# Altium integrated library Diode-SMD_V2.IntLib: 415 symbols (part 1 of 2)
Pins are listed as number, name and electrical type; pins without a type are passive.

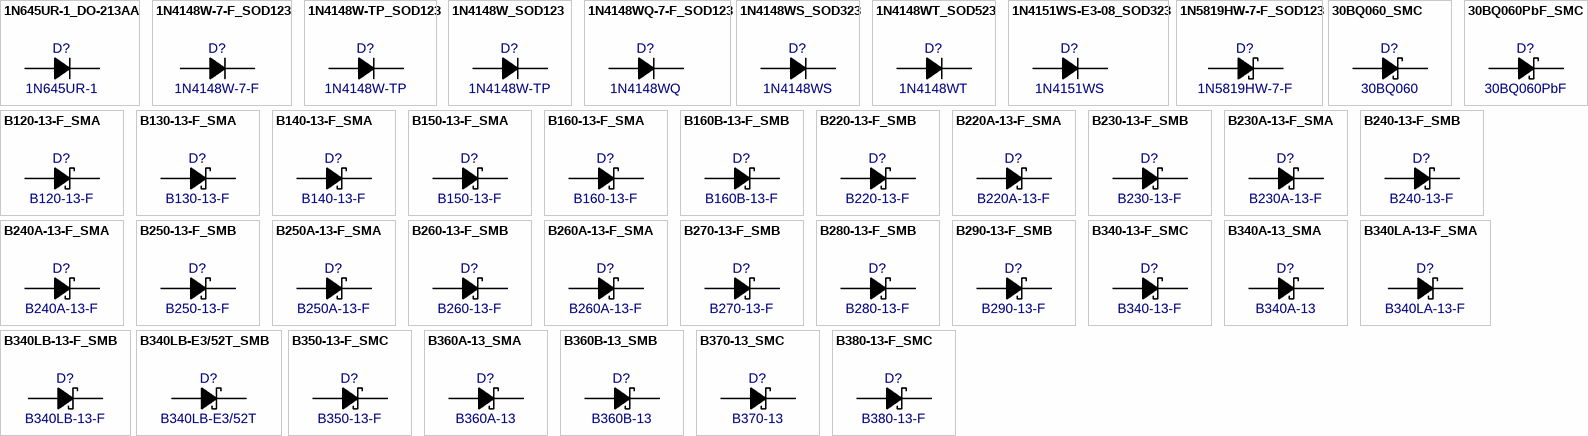
[diagram p0: symbols 1N645UR-1_DO-213AA to B380-13-F_SMC]

## 1N645UR-1_DO-213AA
designator D?, comment 1N645UR-1
Diode Silicon Rectifier 225V 400mA; Manufacturer: Microsemi; Package: DO-213AA; EDM-PN: *; Text2: *; Text1: *; Value: 1N645UR-1; SAAB PN: *; DCE Part No: *; Part Number: 1N645UR-1
footprint DO-213AA (DO-213AA 3.5x1.65mm)
pins: 1 C, 2 A

## 1N4148W-7-F_SOD123
designator D?, comment 1N4148W-7-F
Diode High Speed Switching 100V 150mA; Manufacturer: Diodes; Package: SOD123; EDM-PN: *; Text2: *; Text1: *; Value: 1N4148W-7-F; SAAB PN: *; DCE Part No: *; Part Number: 1N4148W-7-F
footprint SOD123 (SOD 123 2.85x1.7mm)
pins: 1 C, 2 A

## 1N4148W-TP_SOD123
designator D?, comment 1N4148W-TP
Diode High Speed Switching 100V 150mA; Manufacturer: MCC; EDM-PN: DIO242; Package: SOD123; Text2: *; Text1: *; Value: 1N4148W-TP; SAAB PN: *; Part Number: 1N4148W-TP; DCE Part No: *
footprint SOD123 (SOD 123 2.85x1.7mm)
pins: 1 C, 2 A

## 1N4148W_SOD123
designator D?, comment 1N4148W-TP
Diode High Speed Switching 100V 150mA; Manufacturer: MCC; Package: SOD123; EDM-PN: *; Text2: *; Text1: *; Value: 1N4148W-TP; SAAB PN: *; DCE Part No: *; Part Number: 1N4148W-TP
footprint SOD123 (SOD 123 2.85x1.7mm)
pins: 1 C, 2 A

## 1N4148WQ-7-F_SOD123
designator D?, comment value 1N4148WQ  (hidden comment: 1N4148WQ-7-F)
Diode Switching 100V 300mA; Manufacturer: Diodes; Package: SOD123; EDM-PN: *; Text2: *; Text1: *; SAAB PN: *; Part Number: 1N4148WQ-7-F; DCE Part No: *
footprint SOD123 (SOD 123 2.85x1.7mm)
pins: 1 C, 2 A

## 1N4148WS_SOD323
designator D?, comment 1N4148WS
Diode Fast Switching 75V 150mA; Manufacturer: Diodes; EDM-PN: DIO195; Package: SOD323; Text2: *; Text1: *; Value: 1N4148WS; SAAB PN: *; Part Number: 1N4148WS; DCE Part No: *
footprint SOD323 (Diode, SOD323 2-Leads, Body 1.7x1.25mm, IPC Medium Density)
pins: 1 C, 2 A

## 1N4148WT_SOD523
designator D?, comment 1N4148WT
Diode General Purpose 75V 200mA; Manufacturer: On Semi; EDM-PN: DIO284; Package: SOD523; Text2: *; Text1: *; Value: 1N4148WT; SAAB PN: *; Part Number: 1N4148WT; DCE Part No: *
footprint SOD523 (SOD523 1.25x0.85mm)
pins: 1 C, 2 A

## 1N4151WS-E3-08_SOD323
designator D?, comment value 1N4151WS  (hidden comment: 1N4151WS-E3-08)
Diode General Purpose 50V 150mA; Manufacturer: Vishay; Package: SOD323; EDM-PN: *; Text2: *; Text1: *; SAAB PN: *; Part Number: 1N4151WS-E3-08; DCE Part No: *
footprint SOD323 (Diode, SOD323 2-Leads, Body 1.7x1.25mm, IPC Medium Density)
pins: 1 C, 2 A

## 1N5819HW-7-F_SOD123
designator D?, comment 1N5819HW-7-F
Diode Schottky Barrier Rectifier 40V 1Amp; Manufacturer: Diodes; Package: SOD123; EDM-PN: *; Text2: *; Text1: *; Value: 1N5819HW-7-F; SAAB PN: *; Part Number: 1N5819HW-7-F; DCE Part No: *
footprint SOD123 (SOD 123 2.85x1.7mm)
pins: 1 C, 2 A

## 30BQ060_SMC
designator D?, comment 30BQ060
Diode Schottky Rectifier; Manufacturer: IRF; Package: SMC; EDM-PN: *; Text2: *; Text1: *; Value: 30BQ060; SAAB PN: *; DCE Part No: *; Part Number: 30BQ060
footprint SMC (Molded Diode, 2-Leads, Body 6.9x5.8mm, IPC Medium Density)
pins: 1 C, 2 A

## 30BQ060PbF_SMC
designator D?, comment 30BQ060PbF
Diode Schottky Rectifier; Manufacturer: IRF; Package: SMC; EDM-PN: *; Text2: *; Text1: *; Value: 30BQ060PbF; SAAB PN: *; Part Number: 30BQ060PbF; DCE Part No: *
footprint SMC (Molded Diode, 2-Leads, Body 6.9x5.8mm, IPC Medium Density)
pins: 1 C, 2 A

## B120-13-F_SMA
designator D?, comment B120-13-F
Diode Schottky Power Rectifier 1A 20V; Manufacturer: Diodes; EDM-PN: DIO132; Package: SMA; Text2: *; Text1: *; Value: B120-13-F; SAAB PN: *; DCE Part No: *; Part Number: B120-13-F
footprint SMA (SMA 5.6x2.95mm)
pins: 1 C, 2 A

## B130-13-F_SMA
designator D?, comment B130-13-F
Diode Schottky Power Rectifier 1A 30V; Manufacturer: Diodes; Package: SMA; EDM-PN: *; Text2: *; Text1: *; Value: B130-13-F; SAAB PN: *; Part Number: B130-13-F; DCE Part No: *
footprint SMA (SMA 5.6x2.95mm)
pins: 1 C, 2 A

## B140-13-F_SMA
designator D?, comment B140-13-F
Diode Schottky Power Rectifier 1A 40V; Manufacturer: Diodes; EDM-PN: DIO144; Package: SMA; Text2: *; Text1: *; Value: B140-13-F; SAAB PN: *; Part Number: B140-13-F; DCE Part No: *
footprint SMA (SMA 5.6x2.95mm)
pins: 1 C, 2 A

## B150-13-F_SMA
designator D?, comment B150-13-F
Diode Schottky Power Rectifier 1A 50V; Manufacturer: Diodes; Package: SMA; EDM-PN: *; Text2: *; Text1: *; Value: B150-13-F; SAAB PN: *; Part Number: B150-13-F; DCE Part No: *
footprint SMA (SMA 5.6x2.95mm)
pins: 1 C, 2 A

## B160-13-F_SMA
designator D?, comment B160-13-F
Diode Schottky Power Rectifier 1A 60V; Manufacturer: Diodes; Package: SMA; EDM-PN: *; Text2: *; Text1: *; Value: B160-13-F; SAAB PN: *; Part Number: B160-13-F; DCE Part No: *
footprint SMA (SMA 5.6x2.95mm)
pins: 1 C, 2 A

## B160B-13-F_SMB
designator D?, comment B160B-13-F
Diode Schottky Rectifier 1Amp 60V; Manufacturer: Diodes; Package: SMB; EDM-PN: *; Text2: *; Text1: *; Value: B160B-13-F; SAAB PN: *; Part Number: B160B-13-F; DCE Part No: *
footprint SMB (SMB 4.75x3.94mm)
pins: 1 C, 2 A

## B220-13-F_SMB
designator D?, comment B220-13-F
Diode Schottky Power Rectifier 2A 20V; Manufacturer: Diodes; Package: SMB; EDM-PN: *; Text2: *; Text1: *; Value: B220-13-F; SAAB PN: *; DCE Part No: *; Part Number: B220-13-F
footprint SMB (SMB 4.75x3.94mm)
pins: 1 C, 2 A

## B220A-13-F_SMA
designator D?, comment B220A-13-F
Diode Schottky Power Rectifier 2A 20V; Manufacturer: Diodes; Package: SMA; EDM-PN: *; Text2: *; Text1: *; Value: B220A-13-F; SAAB PN: *; DCE Part No: *; Part Number: B220A-13-F
footprint SMA (SMA 5.6x2.95mm)
pins: 1 C, 2 A

## B230-13-F_SMB
designator D?, comment B230-13-F
Diode Schottky Power Rectifier 2A 30V; Manufacturer: Diodes; Package: SMB; EDM-PN: *; Text2: *; Text1: *; Value: B230-13-F; SAAB PN: *; DCE Part No: *; Part Number: B230-13-F
footprint SMB (SMB 4.75x3.94mm)
pins: 1 C, 2 A

## B230A-13-F_SMA
designator D?, comment B230A-13-F
Diode Schottky Power Rectifier 2A 30V; Manufacturer: Diodes; Package: SMA; EDM-PN: *; Text2: *; Text1: *; Value: B230A-13-F; SAAB PN: *; Part Number: B230A-13-F; DCE Part No: *
footprint SMA (SMA 5.6x2.95mm)
pins: 1 C, 2 A

## B240-13-F_SMB
designator D?, comment B240-13-F
Diode Schottky Power Rectifier 2A 40V; Manufacturer: Diodes; Package: SMB; EDM-PN: *; Text2: *; Text1: *; Value: B240-13-F; SAAB PN: *; Part Number: B240-13-F; DCE Part No: *
footprint SMB (SMB 4.75x3.94mm)
pins: 1 C, 2 A

## B240A-13-F_SMA
designator D?, comment B240A-13-F
Diode Schottky Power Rectifier 2A 40V; Manufacturer: Diodes; Package: SMA; EDM-PN: *; Text2: *; Text1: *; Value: B240A-13-F; SAAB PN: *; Part Number: B240A-13-F; DCE Part No: *
footprint SMA (SMA 5.6x2.95mm)
pins: 1 C, 2 A

## B250-13-F_SMB
designator D?, comment B250-13-F
Diode Schottky Power Rectifier 2A 50V; Manufacturer: Diodes; Package: SMB; EDM-PN: *; Text2: *; Text1: *; Value: B250-13-F; SAAB PN: *; Part Number: B250-13-F; DCE Part No: *
footprint SMB (SMB 4.75x3.94mm)
pins: 1 C, 2 A

## B250A-13-F_SMA
designator D?, comment B250A-13-F
Diode Schottky Power Rectifier 2A 50V; Manufacturer: Diodes; Package: SMA; EDM-PN: *; Text2: *; Text1: *; Value: B250A-13-F; SAAB PN: *; Part Number: B250A-13-F; DCE Part No: *
footprint SMA (SMA 5.6x2.95mm)
pins: 1 C, 2 A

## B260-13-F_SMB
designator D?, comment B260-13-F
Diode Schottky Power Rectifier 2A 60V; Manufacturer: Diodes; Package: SMB; EDM-PN: *; Text2: *; Text1: *; Value: B260-13-F; SAAB PN: *; Part Number: B260-13-F; DCE Part No: *
footprint SMB (SMB 4.75x3.94mm)
pins: 1 C, 2 A

## B260A-13-F_SMA
designator D?, comment B260A-13-F
Diode Schottky Power Rectifier 2A 60V; Manufacturer: Diodes; Package: SMA; EDM-PN: *; Text2: *; Text1: *; Value: B260A-13-F; SAAB PN: *; Part Number: B260A-13-F; DCE Part No: *
footprint SMA (SMA 5.6x2.95mm)
pins: 1 C, 2 A

## B270-13-F_SMB
designator D?, comment B270-13-F
Diode Schottky Power Rectifier 2A 70V; Manufacturer: Diodes; Package: SMB; EDM-PN: *; Text2: *; Text1: *; Value: B270-13-F; SAAB PN: *; Part Number: B270-13-F; DCE Part No: *
footprint SMB (SMB 4.75x3.94mm)
pins: 1 C, 2 A

## B280-13-F_SMB
designator D?, comment B280-13-F
Diode Schottky Power Rectifier 2A 80V; Manufacturer: Diodes; Package: SMB; EDM-PN: *; Text2: *; Text1: *; Value: B280-13-F; SAAB PN: *; Part Number: B280-13-F; DCE Part No: *
footprint SMB (SMB 4.75x3.94mm)
pins: 1 C, 2 A

## B290-13-F_SMB
designator D?, comment B290-13-F
Diode Schottky Power Rectifier 2A 90V; Manufacturer: Diodes; Package: SMB; EDM-PN: *; Text2: *; Text1: *; Value: B290-13-F; SAAB PN: *; Part Number: B290-13-F; DCE Part No: *
footprint SMB (SMB 4.75x3.94mm)
pins: 1 C, 2 A

## B340-13-F_SMC
designator D?, comment B340-13-F
Diode Schottky Barrier Rectifier 40V 3Amp; Manufacturer: Diodes; Package: SMC; EDM-PN: *; Text2: *; Text1: *; Value: B340-13-F; SAAB PN: *; Part Number: B340-13-F; DCE Part No: *
footprint SMC (Molded Diode, 2-Leads, Body 6.9x5.8mm, IPC Medium Density)
pins: 1 C, 2 A

## B340A-13_SMA
designator D?, comment B340A-13
Diode Schottky Barrier Rectifier 40V 3Amp; Manufacturer: Diodes; Package: SMA; EDM-PN: *; Text2: *; Text1: *; Value: B340A-13; SAAB PN: *; Part Number: B340A-13; DCE Part No: *
footprint SMA (SMA 5.6x2.95mm)
pins: 1 C, 2 A

## B340LA-13-F_SMA
designator D?, comment B340LA-13-F
Diode Schottky Barrier Rectifier 40V 3Amp; Manufacturer: Diodes; Package: SMA; EDM-PN: *; Text2: *; Text1: *; Value: B340LA-13-F; SAAB PN: *; Part Number: B340LA-13-F; DCE Part No: *
footprint SMA (SMA 5.6x2.95mm)
pins: 1 C, 2 A

## B340LB-13-F_SMB
designator D?, comment B340LB-13-F
Diode Schottky Rectifier 40V 3Amp; Manufacturer: Diodes; Package: SMB; EDM-PN: *; Text2: *; Text1: *; Value: B340LB-13-F; SAAB PN: *; Part Number: B340LB-13-F; DCE Part No: *
footprint SMB (SMB 4.75x3.94mm)
pins: 1 C, 2 A

## B340LB-E3/52T_SMB
designator D?, comment B340LB-E3/52T
Diode Schottky Rectifier 40V 3Amp; Manufacturer: Vishay; Package: SMB; EDM-PN: *; Text2: *; Text1: *; Value: B340LB-E3/52T; SAAB PN: *; Part Number: B340LB-E3/52T; DCE Part No: *
footprint SMB (SMB 4.75x3.94mm)
pins: 1 C, 2 A

## B350-13-F_SMC
designator D?, comment B350-13-F
Diode Schottky Rectifier 50V 3Amp; Manufacturer: Diodes; Package: SMC; EDM-PN: *; Text2: *; Text1: *; Value: B350-13-F; SAAB PN: *; Part Number: B350-13-F; DCE Part No: *
footprint SMC (Molded Diode, 2-Leads, Body 6.9x5.8mm, IPC Medium Density)
pins: 1 C, 2 A

## B360A-13_SMA
designator D?, comment B360A-13
Diode Schottky Barrier Rectifier 60V 3Amp; Manufacturer: Diodes; EDM-PN: DIO156; Package: SMA; Text2: *; Text1: *; Value: B360A-13; SAAB PN: *; Part Number: B360A-13; DCE Part No: *
footprint SMA (SMA 5.6x2.95mm)
pins: 1 C, 2 A

## B360B-13_SMB
designator D?, comment B360B-13
Diode Schottky Barrier Rectifier 60V 3Amp; Manufacturer: Diodes; Package: SMB; EDM-PN: *; Text2: *; Text1: *; Value: B360B-13; SAAB PN: *; Part Number: B360B-13; DCE Part No: *
footprint SMB (SMB 4.75x3.94mm)
pins: 1 C, 2 A

## B370-13_SMC
designator D?, comment B370-13
Diode Schottky Barrier Rectifier 70V 3Amp; Manufacturer: Diodes; Package: SMC; EDM-PN: *; Text2: *; Text1: *; Value: B370-13; SAAB PN: *; Part Number: B370-13; DCE Part No: *
footprint SMC (Molded Diode, 2-Leads, Body 6.9x5.8mm, IPC Medium Density)
pins: 1 C, 2 A

## B380-13-F_SMC
designator D?, comment B380-13-F
Diode Schottky Barrier Rectifier 80V 3Amp; Manufacturer: Diodes; Package: SMC; EDM-PN: *; Text2: *; Text1: *; Value: B380-13-F; SAAB PN: *; Part Number: B380-13-F; DCE Part No: *
footprint SMC (Molded Diode, 2-Leads, Body 6.9x5.8mm, IPC Medium Density)
pins: 1 C, 2 A

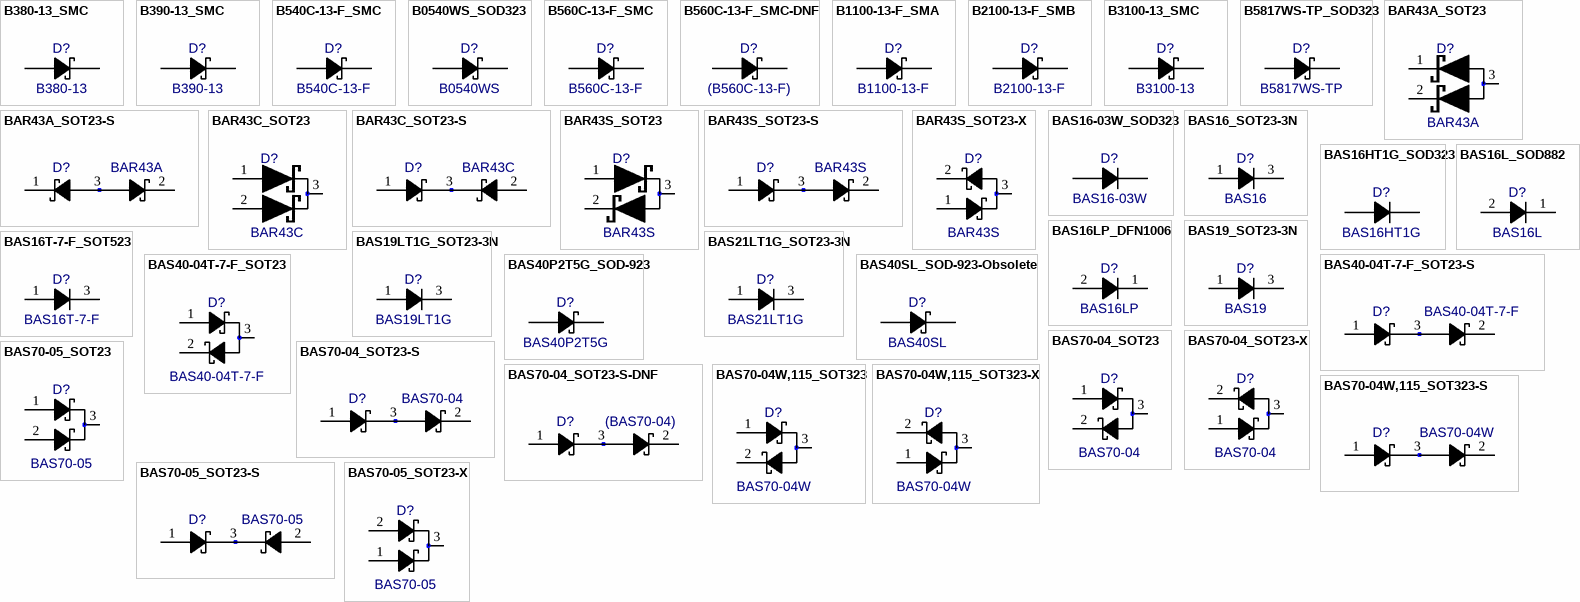
[diagram p1: symbols B380-13_SMC to BAS70-05_SOT23-X]

## B380-13_SMC
designator D?, comment B380-13
Diode Schottky Barrier Rectifier 80V 3Amp; Manufacturer: Diodes; Package: SMC; EDM-PN: *; Text2: *; Text1: *; Value: B380-13; SAAB PN: *; Part Number: B380-13; DCE Part No: *
footprint SMC (Molded Diode, 2-Leads, Body 6.9x5.8mm, IPC Medium Density)
pins: 1 C, 2 A

## B390-13_SMC
designator D?, comment B390-13
Diode Schottky Barrier Rectifier 90V 3Amp; Manufacturer: Diodes; Package: SMC; EDM-PN: *; Text2: *; Text1: *; Value: B390-13; SAAB PN: *; Part Number: B390-13; DCE Part No: *
footprint SMC (Molded Diode, 2-Leads, Body 6.9x5.8mm, IPC Medium Density)
pins: 1 C, 2 A

## B540C-13-F_SMC
designator D?, comment B540C-13-F
Diode Schottky Barrier Rectifier 40V 5Amp; Manufacturer: Diodes; Package: SMC; EDM-PN: *; Text2: *; Text1: *; Value: B540C-13-F; SAAB PN: *; Part Number: B540C-13-F; DCE Part No: *
footprint SMC (Molded Diode, 2-Leads, Body 6.9x5.8mm, IPC Medium Density)
pins: 1 C, 2 A

## B0540WS_SOD323
designator D?, comment B0540WS
Diode Schottky Barrier Rectifier 40V 0.5A; Manufacturer: Diodes; EDM-PN: DIO185; Package: SOD323; Text2: *; Text1: *; Value: B0540WS; SAAB PN: *; Part Number: B0540WS; DCE Part No: *
footprint SOD323 (Diode, SOD323 2-Leads, Body 1.7x1.25mm, IPC Medium Density)
pins: 1 C, 2 A

## B560C-13-F_SMC
designator D?, comment B560C-13-F
Diode Schottky Barrier Rectifier 60V 5Amp; Manufacturer: Diodes; EDM-PN: DIO135; Package: SMC; Text2: *; Text1: *; Value: B560C-13-F; SAAB PN: *; Part Number: B560C-13-F; DCE Part No: *
footprint SMC (Molded Diode, 2-Leads, Body 6.9x5.8mm, IPC Medium Density)
pins: 1 C, 2 A

## B560C-13-F_SMC-DNF
designator D?, comment value (B560C-13-F)  (hidden comment: B560C-13-F)
Diode Schottky Barrier Rectifier 60V 5Amp - Do not Fit; Manufacturer: Diodes; Part Number: DNF - B560C-13-F; EDM-PN: DIO135; Package: SMC; Text2: *; Text1: *; SAAB PN: *; DCE Part No: *
footprint SMC (Molded Diode, 2-Leads, Body 6.9x5.8mm, IPC Medium Density)
pins: 1 C, 2 A

## B1100-13-F_SMA
designator D?, comment B1100-13-F
Diode Schottky Power Rectifier  100V 1A; Manufacturer: Diodes; Package: SMA; EDM-PN: *; Text2: *; Text1: *; Value: B1100-13-F; SAAB PN: *; Part Number: B1100-13-F; DCE Part No: *
footprint SMA (SMA 5.6x2.95mm)
pins: 1 C, 2 A

## B2100-13-F_SMB
designator D?, comment B2100-13-F
Diode Schottky Power Rectifier 2A 100V; Manufacturer: Diodes; Package: SMB; EDM-PN: *; Text2: *; Text1: *; Value: B2100-13-F; SAAB PN: *; Part Number: B2100-13-F; DCE Part No: *
footprint SMB (SMB 4.75x3.94mm)
pins: 1 C, 2 A

## B3100-13_SMC
designator D?, comment B3100-13
Diode Schottky Barrier Rectifier 100V 3Amp; Manufacturer: Diodes; Package: SMC; EDM-PN: *; Text2: *; Text1: *; Value: B3100-13; SAAB PN: *; Part Number: B3100-13; DCE Part No: *
footprint SMC (Molded Diode, 2-Leads, Body 6.9x5.8mm, IPC Medium Density)
pins: 1 C, 2 A

## B5817WS-TP_SOD323
designator D?, comment B5817WS-TP
Diode Schottky 20V 1A; Manufacturer: MCC; Package: SOD323; EDM-PN: *; Text2: *; Text1: *; SAAB PN: *; Part Number: B5817WS-TP; Value: B5817WS-TP; DCE Part No: *
footprint SOD323 (Diode, SOD323 2-Leads, Body 1.7x1.25mm, IPC Medium Density)
pins: 1 C, 2 A

## BAR43A_SOT23
designator D?, comment BAR43A
Diode Schottky 30V 200mA; Manufacturer: Fairchild; Package: SOT23; EDM-PN: *; Text2: *; Text1: *; Value: BAR43A; SAAB PN: *; DCE Part No: *; Part Number: BAR43A
footprint SOT23 (SOT23, 3-Leads, Body 3.0x1.4mm (max), Pitch 0.95mm, IPC Medium Density)
pins: 1 A1, 2 A2, 3 C

## BAR43A_SOT23-S
designator D?, comment BAR43A
Diode Schottky 30V 200mA; Manufacturer: Fairchild; Package: SOT23; EDM-PN: *; Text2: *; Text1: *; Value: BAR43A; SAAB PN: *; Part Number: BAR43A; DCE Part No: *
footprint SOT23 (SOT23, 3-Leads, Body 3.0x1.4mm (max), Pitch 0.95mm, IPC Medium Density)
pins: 1 A1, 2 A2, 3 C

## BAR43C_SOT23
designator D?, comment BAR43C
Diode Schottky 30V 200mA; Manufacturer: Fairchild; Package: SOT23; EDM-PN: *; Text2: *; Text1: *; Value: BAR43C; SAAB PN: *; Part Number: BAR43C; DCE Part No: *
footprint SOT23 (SOT23, 3-Leads, Body 3.0x1.4mm (max), Pitch 0.95mm, IPC Medium Density)
pins: 1 A1, 2 A2, 3 C

## BAR43C_SOT23-S
designator D?, comment BAR43C
Diode Schottky 30V 200mA; Manufacturer: Fairchild; Package: SOT23; EDM-PN: *; Text2: *; Text1: *; Value: BAR43C; SAAB PN: *; Part Number: BAR43C; DCE Part No: *
footprint SOT23 (SOT23, 3-Leads, Body 3.0x1.4mm (max), Pitch 0.95mm, IPC Medium Density)
pins: 1 A1, 2 A2, 3 C

## BAR43S_SOT23
designator D?, comment BAR43S
Diode Schottky 30V 200mA; Manufacturer: Fairchild; Package: SOT23; EDM-PN: *; Text2: *; Text1: *; Value: BAR43S; SAAB PN: *; Part Number: BAR43S; DCE Part No: *
footprint SOT23 (SOT23, 3-Leads, Body 3.0x1.4mm (max), Pitch 0.95mm, IPC Medium Density)
pins: 1 A1, 2 A2, 3 C

## BAR43S_SOT23-S
designator D?, comment BAR43S
Diode Schottky 30V 200mA; Manufacturer: Fairchild; Package: SOT23; EDM-PN: *; Text2: *; Text1: *; Value: BAR43S; SAAB PN: *; Part Number: BAR43S; DCE Part No: *
footprint SOT23 (SOT23, 3-Leads, Body 3.0x1.4mm (max), Pitch 0.95mm, IPC Medium Density)
pins: 1 A1, 2 A2, 3 C

## BAR43S_SOT23-X
designator D?, comment BAR43S
Diode Schottky 30V 200mA; Manufacturer: Fairchild; Package: SOT23; EDM-PN: *; Text2: *; Text1: *; Value: BAR43S; SAAB PN: *; Part Number: BAR43S; DCE Part No: *
footprint SOT23 (SOT23, 3-Leads, Body 3.0x1.4mm (max), Pitch 0.95mm, IPC Medium Density)
pins: 1 A1, 2 A2, 3 C

## BAS16-03W_SOD323
designator D?, comment BAS16-03W
Diode Switching; Manufacturer: Infineon; Package: SOD323; EDM-PN: *; Text2: *; Text1: *; Value: BAS16-03W; SAAB PN: *; DCE Part No: *; Part Number: BAS16-03W
footprint SOD323 (Diode, SOD323 2-Leads, Body 1.7x1.25mm, IPC Medium Density)
pins: 1 C, 2 A

## BAS16_SOT23-3N
designator D?, comment BAS16
Diode Small Signal; Manufacturer: Fairchild; Package: SOT23; EDM-PN: *; Text2: *; Text1: *; Value: BAS16; SAAB PN: *; Part Number: BAS16; DCE Part No: *
footprint SOT23 (SOT23, 3-Leads, Body 3.0x1.4mm (max), Pitch 0.95mm, IPC Medium Density)
pins: 1 A, 3 C

## BAS16HT1G_SOD323
designator D?, comment BAS16HT1G
Diode Switching 100V 200mA; Manufacturer: On Semi; Package: SOD323; EDM-PN: *; Text2: *; Text1: *; Value: BAS16HT1G; SAAB PN: *; Part Number: BAS16HT1G; DCE Part No: *
footprint SOD323 (Diode, SOD323 2-Leads, Body 1.7x1.25mm, IPC Medium Density)
pins: 1 C, 2 A

## BAS16L_SOD882
designator D?, comment BAS16L
Diode High Speed Switching; Manufacturer: NXP; Package: SOD882; EDM-PN: *; Text2: *; Text1: *; Value: BAS16L; SAAB PN: *; Part Number: BAS16L; DCE Part No: *
footprint SOD882 (Diode, SOD882 2-Leads, Body 1.02x0.62mm, IPC Medium Density)
pins: 1 C, 2 A

## BAS16LP_DFN1006
designator D?, comment BAS16LP
Diode Switching; Manufacturer: Diodes; Package: X1-DFN1006-2; EDM-PN: *; Text2: *; Text1: *; Value: BAS16LP; SAAB PN: *; Part Number: BAS16LP; DCE Part No: *
footprint X1-DFN1006-2 (X1-DFN1006-2 1.0x0.6mm)
pins: 1 C, 2 A

## BAS16T-7-F_SOT523
designator D?, comment BAS16T-7-F
Diode Fast Switching; Manufacturer: Diodes; Package: SOT523; EDM-PN: *; Text2: *; Text1: *; Value: BAS16T-7-F; SAAB PN: *; Part Number: BAS16T-7-F; DCE Part No: *
footprint SOT523 (SOT523 1.7x0.85mm)
pins: 1 A, 3 C

## BAS19_SOT23-3N
designator D?, comment BAS19
Diode Small Signal 120V 200mA; Manufacturer: Fairchild; Package: SOT23; EDM-PN: *; Text2: *; Text1: *; Value: BAS19; SAAB PN: *; Part Number: BAS19; DCE Part No: *
footprint SOT23 (SOT23, 3-Leads, Body 3.0x1.4mm (max), Pitch 0.95mm, IPC Medium Density)
pins: 1 A, 3 C

## BAS19LT1G_SOT23-3N
designator D?, comment BAS19LT1G
Diode High Voltage Switching 120V 200mA; Manufacturer: On Semi; Package: SOT23; EDM-PN: *; Text2: *; Text1: *; Value: BAS19LT1G; SAAB PN: *; Part Number: BAS19LT1G; DCE Part No: *
footprint SOT23 (SOT23, 3-Leads, Body 3.0x1.4mm (max), Pitch 0.95mm, IPC Medium Density)
pins: 1 A, 3 C

## BAS21LT1G_SOT23-3N
designator D?, comment BAS21LT1G
Diode High Voltage Switching 250V 200mA; Manufacturer: On Semi; Package: SOT23; EDM-PN: *; Text2: *; Text1: *; Value: BAS21LT1G; SAAB PN: *; Part Number: BAS21LT1G; DCE Part No: *
footprint SOT23 (SOT23, 3-Leads, Body 3.0x1.4mm (max), Pitch 0.95mm, IPC Medium Density)
pins: 1 A, 3 C

## BAS40-04T-7-F_SOT23
designator D?, comment BAS40-04T-7-F
Diode Schottky Dual Serial 40V 200mA; Manufacturer: Diodes; DCE Part No: 10286; Package: SOT23; EDM-PN: *; Text2: *; Text1: *; Value: BAS40-04T-7-F; SAAB PN: *; Part Number: BAS40-04T-7-F
footprint SOT23 (SOT23, 3-Leads, Body 3.0x1.4mm (max), Pitch 0.95mm, IPC Medium Density)
pins: 1 A1, 2 A2, 3 C

## BAS40-04T-7-F_SOT23-S
designator D?, comment BAS40-04T-7-F
Diode Schottky Dual Serial 40V 200mA; Manufacturer: Diodes; DCE Part No: 10286; Package: SOT23; EDM-PN: *; Text2: *; Text1: *; Value: BAS40-04T-7-F; SAAB PN: *; Part Number: BAS40-04T-7-F
footprint SOT23 (SOT23, 3-Leads, Body 3.0x1.4mm (max), Pitch 0.95mm, IPC Medium Density)
pins: 1 A1, 2 A2, 3 C

## BAS40P2T5G_SOD-923
designator D?, comment BAS40P2T5G
Diode Schottky Rectifier 40V 120mA; Manufacturer: On Semi; Package: SOD923F; EDM-PN: *; Text2: *; Text1: *; Value: BAS40P2T5G; SAAB PN: *; Part Number: BAS40P2T5G; DCE Part No: *
footprint SOD923F (SOD923F 0.85x0.65mm)
pins: 1 C, 2 A

## BAS40SL_SOD-923-Obsolete
designator D?, comment BAS40SL
Diode Schottky Rectifier 40V 100mA; Manufacturer: On Semi; Package: SOD923F; EDM-PN: *; Text2: *; Text1: *; Value: BAS40SL; SAAB PN: *; DCE Part No: *; Part Number: BAS40SL
footprint SOD923F (SOD923F 0.85x0.65mm)
pins: 1 C, 2 A

## BAS70-04_SOT23
designator D?, comment BAS70-04
Diode Schottky Dual Serial 70V 70mA; Manufacturer: Various; EDM-PN: DIO94; Package: SOT23; Text2: *; Text1: *; Value: BAS70-04; SAAB PN: *; Part Number: BAS70-04; DCE Part No: *
footprint SOT23 (SOT23, 3-Leads, Body 3.0x1.4mm (max), Pitch 0.95mm, IPC Medium Density)
pins: 1 A1, 2 A2, 3 C

## BAS70-04_SOT23-S
designator D?, comment BAS70-04
Diode Schottky Dual Serial 70V 70mA; Manufacturer: Various; EDM-PN: DIO94; Package: SOT23; Text2: *; Text1: *; Value: BAS70-04; SAAB PN: *; Part Number: BAS70-04; DCE Part No: *
footprint SOT23 (SOT23, 3-Leads, Body 3.0x1.4mm (max), Pitch 0.95mm, IPC Medium Density)
pins: 1 A1, 2 A2, 3 C

## BAS70-04_SOT23-S-DNF
designator D?, comment value (BAS70-04)  (hidden comment: BAS70-04-DNF)
Diode Schottky Dual Serial 70V 70mA - Do not Fit; Manufacturer: Various; Part Number: DNF - BAS70-04; EDM-PN: DIO94; Package: SOT23; Text2: *; Text1: *; SAAB PN: *; DCE Part No: *
footprint SOT23 (SOT23, 3-Leads, Body 3.0x1.4mm (max), Pitch 0.95mm, IPC Medium Density)
pins: 1 A1, 2 A2, 3 C

## BAS70-04_SOT23-X
designator D?, comment BAS70-04
Diode Schottky Dual Serial 70V 70mA; Manufacturer: Various; EDM-PN: DIO94; Package: SOT23; Text2: *; Text1: *; Value: BAS70-04; SAAB PN: *; Part Number: BAS70-04; DCE Part No: *
footprint SOT23 (SOT23, 3-Leads, Body 3.0x1.4mm (max), Pitch 0.95mm, IPC Medium Density)
pins: 1 A1, 2 A2, 3 C

## BAS70-04W,115_SOT323
designator D?, comment Part Number: BAS70-04W  (hidden comment: BAS70-04W,115)
Diode Schottky Dual Serial 70V 70mA; Manufacturer: Nexperia; EDM-PN: DIO181; Package: SOT323; Text2: *; Text1: *; Value: BAS70-04W,115; SAAB PN: *; DCE Part No: *
footprint SOT323 (SOT323 2.2x1.3mm)
pins: 1 A1, 2 A2, 3 C

## BAS70-04W,115_SOT323-S
designator D?, comment Part Number: BAS70-04W  (hidden comment: BAS70-04W,115)
Diode Schottky Dual Serial 70V 70mA; Manufacturer: Nexperia; EDM-PN: DIO181; Package: SOT323; Text2: *; Text1: *; Value: BAS70-04W,115; SAAB PN: *; DCE Part No: *
footprint SOT323 (SOT323 2.2x1.3mm)
pins: 1 A1, 2 A2, 3 C

## BAS70-04W,115_SOT323-X
designator D?, comment Part Number: BAS70-04W  (hidden comment: BAS70-04W,115)
Diode Schottky Dual Serial 70V 70mA; Manufacturer: Nexperia; EDM-PN: DIO181; Package: SOT323; Text2: *; Text1: *; Value: BAS70-04W,115; SAAB PN: *; DCE Part No: *
footprint SOT323 (SOT323 2.2x1.3mm)
pins: 1 A1, 2 A2, 3 C

## BAS70-05_SOT23
designator D?, comment BAS70-05
Diode Schottky Dual Comm Cathode 70V 70mA; Manufacturer: Various; EDM-PN: DIO97; Package: SOT23; Text2: *; Text1: *; Value: BAS70-05; SAAB PN: *; Part Number: BAS70-05; DCE Part No: *
footprint SOT23 (SOT23, 3-Leads, Body 3.0x1.4mm (max), Pitch 0.95mm, IPC Medium Density)
pins: 1 A1, 2 A2, 3 C

## BAS70-05_SOT23-S
designator D?, comment BAS70-05
Diode Schottky Dual Comm Cathode 70V 70mA; Manufacturer: Various; EDM-PN: DIO97; Package: SOT23; Text2: *; Text1: *; Value: BAS70-05; SAAB PN: *; Part Number: BAS70-05; DCE Part No: *
footprint SOT23 (SOT23, 3-Leads, Body 3.0x1.4mm (max), Pitch 0.95mm, IPC Medium Density)
pins: 1 A1, 2 A2, 3 C

## BAS70-05_SOT23-X
designator D?, comment BAS70-05
Diode Schottky Dual Comm Cathode 70V 70mA; Manufacturer: Various; EDM-PN: DIO97; Package: SOT23; Text2: *; Text1: *; Value: BAS70-05; SAAB PN: *; Part Number: BAS70-05; DCE Part No: *
footprint SOT23 (SOT23, 3-Leads, Body 3.0x1.4mm (max), Pitch 0.95mm, IPC Medium Density)
pins: 1 A1, 2 A2, 3 C

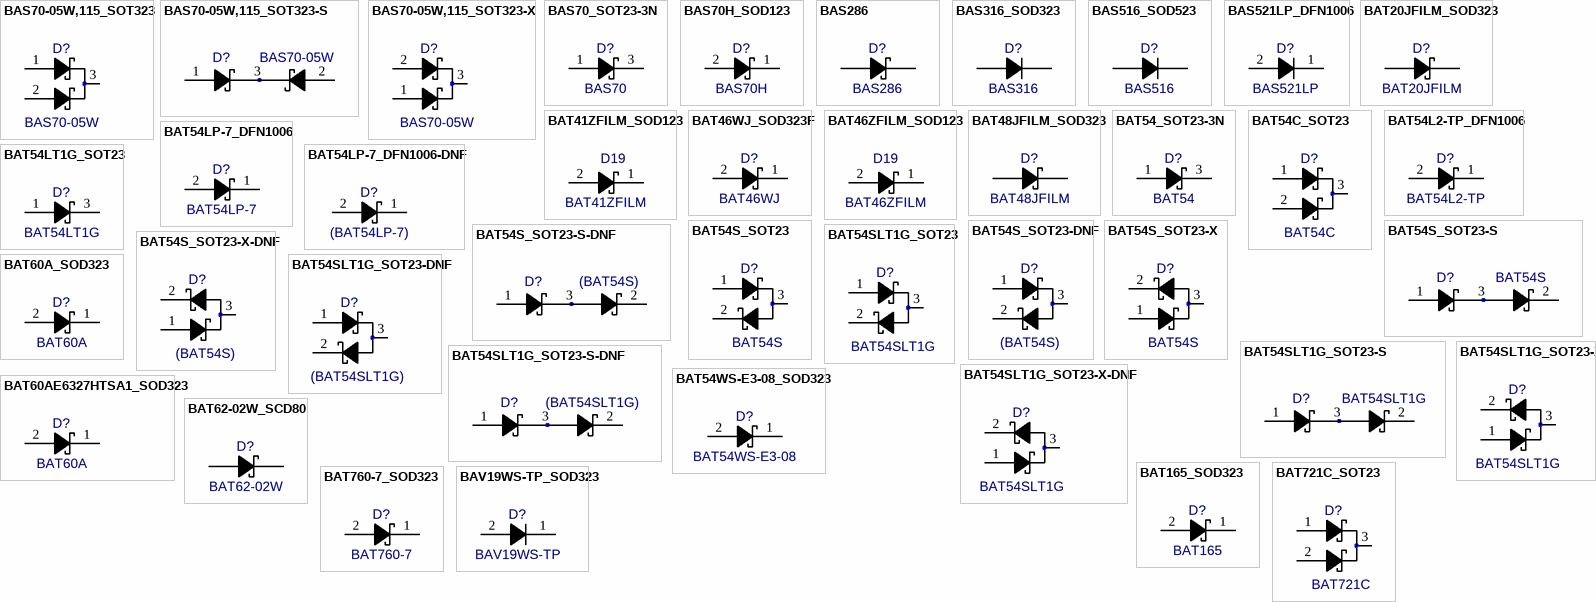
[diagram p2: symbols BAS70-05W,115_SOT323 to BAV19WS-TP_SOD323]

## BAS70-05W,115_SOT323
designator D?, comment Part Number: BAS70-05W  (hidden comment: BAS70-05W,115)
Diode Schottky Common Cathode 70V 70mA; Manufacturer: Nexperia; EDM-PN: DIO279; Package: SOT323; Text2: *; Text1: *; Value: BAS70-05W,115; SAAB PN: *; DCE Part No: *
footprint SOT323 (SOT323 2.2x1.3mm)
pins: 1 A1, 2 A2, 3 C

## BAS70-05W,115_SOT323-S
designator D?, comment Part Number: BAS70-05W  (hidden comment: BAS70-05W,115)
Diode Schottky Common Cathode 70V 70mA; Manufacturer: Nexperia; EDM-PN: DIO279; Package: SOT323; Text2: *; Text1: *; Value: BAS70-05W,115; SAAB PN: *; DCE Part No: *
footprint SOT323 (SOT323 2.2x1.3mm)
pins: 1 A1, 2 A2, 3 C

## BAS70-05W,115_SOT323-X
designator D?, comment Part Number: BAS70-05W  (hidden comment: BAS70-05W,115)
Diode Schottky Common Cathode 70V 70mA; Manufacturer: Nexperia; EDM-PN: DIO279; Package: SOT323; Text2: *; Text1: *; Value: BAS70-05W,115; SAAB PN: *; DCE Part No: *
footprint SOT323 (SOT323 2.2x1.3mm)
pins: 1 A1, 2 A2, 3 C

## BAS70_SOT23-3N
designator D?, comment BAS70
Diode Schottky Rectifier; Manufacturer: Vishay; Package: SOT23; EDM-PN: *; Text2: *; Text1: *; Value: BAS70; SAAB PN: *; Part Number: BAS70; DCE Part No: *
footprint SOT23 (SOT23, 3-Leads, Body 3.0x1.4mm (max), Pitch 0.95mm, IPC Medium Density)
pins: 1 A, 3 C

## BAS70H_SOD123
designator D?, comment BAS70H
Diode Schottky Rectifier; Manufacturer: NXP; Package: SOT123F; EDM-PN: *; Text2: *; Text1: *; Value: BAS70H; SAAB PN: *; Part Number: BAS70H; DCE Part No: *
footprint SOD123F (SOD 123F 2.85x1.7mm)
pins: 1 C, 2 A

## BAS286
designator D?
Diode Schottky Rectifier; Manufacturer: Vishay; Package: SOD80-Q-Melf; EDM-PN: *; Text2: *; Text1: *; Value: BAS286; SAAB PN: *; Part Number: BAS286; DCE Part No: *
footprint SOD80-Q-Melf (Diode, QM SOD80 2-Leads, Body 375x1.6mm, IPC Medium Density)
pins: 1 C, 2 A

## BAS316_SOD323
designator D?, comment BAS316
Diode High Speed (100Volt 250mA); Manufacturer: NXP; Package: SOD323; EDM-PN: *; Text2: *; Text1: *; Value: BAS316; SAAB PN: *; Part Number: BAS316; DCE Part No: *
footprint SOD323 (Diode, SOD323 2-Leads, Body 1.7x1.25mm, IPC Medium Density)
pins: 1 C, 2 A

## BAS516_SOD523
designator D?, comment BAS516
Diode High Speed (75Volt 500mA); Manufacturer: NXP; Package: SOD523; EDM-PN: *; Text2: *; Text1: *; Value: BAS516; SAAB PN: *; Part Number: BAS516; DCE Part No: *
footprint SOD523 (SOD523 1.25x0.85mm)
pins: 1 C, 2 A

## BAS521LP_DFN1006
designator D?, comment BAS521LP
Diode High Voltage Switching; Manufacturer: Diodes; Package: DFN1006-2; EDM-PN: *; Text2: *; Text1: *; Value: BAS521LP; SAAB PN: *; Part Number: BAS521LP; DCE Part No: *
footprint DFN1006-2 (DFN1006-2 1.0x0.6mm)
pins: 1 C, 2 A

## BAT20JFILM_SOD323
designator D?, comment BAT20JFILM
Diode Schottky 1A 23V; Manufacturer: ST; Package: SOD323; EDM-PN: *; Text2: *; Text1: *; Value: BAT20JFILM; SAAB PN: *; Part Number: BAT20JFILM; DCE Part No: *
footprint SOD323 (Diode, SOD323 2-Leads, Body 1.7x1.25mm, IPC Medium Density)
pins: 1 C, 2 A

## BAT41ZFILM_SOD123
designator D19, comment BAT41ZFILM
Diode Schottky Rectifier 200mA 100V; Manufacturer: ST; Package: SOT123; EDM-PN: *; Text2: *; Text1: *; Value: BAT41ZFILM; SAAB PN: *; Part Number: BAT41ZFILM; DCE Part No: *
footprint SOD123 (SOD 123 2.85x1.7mm)
pins: 1 C, 2 A

## BAT46WJ_SOD323F
designator D?, comment BAT46WJ
Diode Schottky Barrier; Manufacturer: NXP; Package: SOD323F; EDM-PN: *; Text2: *; Text1: *; Value: BAT46WJ; SAAB PN: *; Part Number: BAT46WJ; DCE Part No: *
footprint SOD323F (SOD323F 1.7x1.25mm)
pins: 1 C, 2 A

## BAT46ZFILM_SOD123
designator D19, comment BAT46ZFILM
Diode Schottky Rectifier 150mA 100V; Manufacturer: ST; Package: SOT123; EDM-PN: *; Text2: *; Text1: *; Value: BAT46ZFILM; SAAB PN: *; Part Number: BAT46ZFILM; DCE Part No: *
footprint SOD123 (SOD 123 2.85x1.7mm)
pins: 1 C, 2 A

## BAT48JFILM_SOD323
designator D?, comment BAT48JFILM
Diode Schottky Rectifier 40V 350mA; Manufacturer: STM; Package: SOD323; EDM-PN: *; Text2: *; Text1: *; Value: BAT48JFILM; SAAB PN: *; Part Number: BAT48JFILM; DCE Part No: *
footprint SOD323 (Diode, SOD323 2-Leads, Body 1.7x1.25mm, IPC Medium Density)
pins: 1 C, 2 A

## BAT54_SOT23-3N
designator D?, comment BAT54
Diode Schottky Rectifier; Manufacturer: Fairchild; Package: SOT23; EDM-PN: *; Text2: *; Text1: *; Value: BAT54; SAAB PN: *; Part Number: BAT54; DCE Part No: *
footprint SOT23 (SOT23, 3-Leads, Body 3.0x1.4mm (max), Pitch 0.95mm, IPC Medium Density)
pins: 1 A, 3 C

## BAT54C_SOT23
designator D?, comment BAT54C
Diode Schottky 30V 200mA; Manufacturer: Fairchild; Package: SOT23; EDM-PN: *; Text2: *; Text1: *; Value: BAT54C; SAAB PN: *; Part Number: BAT54C; DCE Part No: *
footprint SOT23 (SOT23, 3-Leads, Body 3.0x1.4mm (max), Pitch 0.95mm, IPC Medium Density)
pins: 1 A1, 2 A2, 3 C

## BAT54L2-TP_DFN1006
designator D?, comment BAT54L2-TP
Diode Schottky 30V 200mA; Manufacturer: Micro Commercial; Package: DFN1006-2; EDM-PN: *; Text2: *; Text1: *; Value: BAT54L2-TP; SAAB PN: *; Part Number: BAT54L2-TP; DCE Part No: *
footprint DFN1006-2 (DFN1006-2 1.0x0.6mm)
pins: 1 C, 2 A

## BAT54LP-7_DFN1006
designator D?, comment BAT54LP-7
Diode Schottky 30V 200mA; Manufacturer: Diodes; Package: DFN1006-2; EDM-PN: *; Text2: *; Text1: *; SAAB PN: *; Part Number: BAT54LP-7; Value: BAT54LP-7; DCE Part No: *
footprint DFN1006-2 (DFN1006-2 1.0x0.6mm)
pins: 1 C, 2 A

## BAT54LP-7_DFN1006-DNF
designator D?, comment value (BAT54LP-7)  (hidden comment: BAT54LP-7)
Diode Schottky 30V 200mA - Do not Fit; Manufacturer: Diodes; Part Number: DNF - BAT54LP-7; Package: DFN1006-2; EDM-PN: *; Text2: *; SAAB PN: *; Text1: *; DCE Part No: *
footprint DFN1006-2 (DFN1006-2 1.0x0.6mm)
pins: 1 C, 2 A

## BAT54LT1G_SOT23
designator D?, comment BAT54LT1G
Diode Schottky Rectifier; Manufacturer: On Semi; Package: SOT23; EDM-PN: *; Text2: *; Text1: *; Value: BAT54LT1G; SAAB PN: *; Part Number: BAT54LT1G; DCE Part No: *
footprint SOT23 (SOT23, 3-Leads, Body 3.0x1.4mm (max), Pitch 0.95mm, IPC Medium Density)
pins: 1 A, 3 C

## BAT54S_SOT23
designator D?, comment BAT54S
Diode Schottky 30V 200mA; Manufacturer: On Semi; EDM-PN: DIO73; Reutech PN: 5961-ST-0014; Package: SOT23; Text2: *; Text1: *; Value: BAT54S; SAAB PN: *; Part Number: BAT54S; DCE Part No: *
footprint SOT23 (SOT23, 3-Leads, Body 3.0x1.4mm (max), Pitch 0.95mm, IPC Medium Density)
pins: 1 A1, 2 A2, 3 C

## BAT54S_SOT23-DNF
designator D?, comment value (BAT54S)  (hidden comment: BAT54S-DNF)
Diode Schottky 30V 200mA - Do not Fit; Manufacturer: On Semi; Part Number: DNF - BAT54S; EDM-PN: DIO73; Reutech PN: 5961-ST-0014; Package: SOT23; Text2: *; Text1: *; SAAB PN: *; DCE Part No: *
footprint SOT23 (SOT23, 3-Leads, Body 3.0x1.4mm (max), Pitch 0.95mm, IPC Medium Density)
pins: 1 A1, 2 A2, 3 C

## BAT54S_SOT23-S
designator D?, comment BAT54S
Diode Schottky 30V 200mA; Manufacturer: On Semi; EDM-PN: DIO73; Reutech PN: 5961-ST-0014; Package: SOT23; Text2: *; Text1: *; Value: BAT54S; SAAB PN: *; Part Number: BAT54S; DCE Part No: *
footprint SOT23 (SOT23, 3-Leads, Body 3.0x1.4mm (max), Pitch 0.95mm, IPC Medium Density)
pins: 1 A1, 2 A2, 3 C

## BAT54S_SOT23-S-DNF
designator D?, comment value (BAT54S)  (hidden comment: BAT54S)
Diode Schottky 30V 200mA - Do not Fit; Manufacturer: On Semi; Part Number: DNF - BAT54S; EDM-PN: DIO73; Reutech PN: 5961-ST-0014; Package: SOT23; Text2: *; Text1: *; SAAB PN: *; DCE Part No: *
footprint SOT23 (SOT23, 3-Leads, Body 3.0x1.4mm (max), Pitch 0.95mm, IPC Medium Density)
pins: 1 A1, 2 A2, 3 C

## BAT54S_SOT23-X
designator D?, comment BAT54S
Diode Schottky 30V 200mA; Manufacturer: On Semi; EDM-PN: DIO73; Reutech PN: 5961-ST-0014; Package: SOT23; Text2: *; Text1: *; Value: BAT54S; SAAB PN: *; Part Number: BAT54S; DCE Part No: *
footprint SOT23 (SOT23, 3-Leads, Body 3.0x1.4mm (max), Pitch 0.95mm, IPC Medium Density)
pins: 1 A1, 2 A2, 3 C

## BAT54S_SOT23-X-DNF
designator D?, comment value (BAT54S)  (hidden comment: BAT54S-DNF)
Diode Schottky 30V 200mA - Do not Fit; Manufacturer: On Semi; Part Number: DNF - BAT54S; EDM-PN: DIO73; Reutech PN: 5961-ST-0014; Package: SOT23; Text2: *; Text1: *; SAAB PN: *; DCE Part No: *
footprint SOT23 (SOT23, 3-Leads, Body 3.0x1.4mm (max), Pitch 0.95mm, IPC Medium Density)
pins: 1 A1, 2 A2, 3 C

## BAT54SLT1G_SOT23
designator D?, comment BAT54SLT1G
Diode Schottky 30V 200mA; Manufacturer: On Semi; EDM-PN: DIO73; Reutech PN: 5961-ST-0014; Package: SOT23; Text2: *; Text1: *; Value: BAT54SLT1G; SAAB PN: *; Part Number: BAT54SLT1G; DCE Part No: *
footprint SOT23 (SOT23, 3-Leads, Body 3.0x1.4mm (max), Pitch 0.95mm, IPC Medium Density)
pins: 1 A1, 2 A2, 3 C

## BAT54SLT1G_SOT23-DNF
designator D?, comment value (BAT54SLT1G)  (hidden comment: BAT54SLT1G-DNF)
Diode Schottky 30V 200mA - Do not Fit; Manufacturer: On Semi; Part Number: DNF - BAT54SLT1G; EDM-PN: DIO73; Reutech PN: 5961-ST-0014; Package: SOT23; Text2: *; Text1: *; SAAB PN: *; DCE Part No: *
footprint SOT23 (SOT23, 3-Leads, Body 3.0x1.4mm (max), Pitch 0.95mm, IPC Medium Density)
pins: 1 A1, 2 A2, 3 C

## BAT54SLT1G_SOT23-S
designator D?, comment BAT54SLT1G
Diode Schottky 30V 200mA; Manufacturer: On Semi; EDM-PN: DIO73; Reutech PN: 5961-ST-0014; Package: SOT23; Text2: *; Text1: *; Value: BAT54SLT1G; SAAB PN: *; Part Number: BAT54SLT1G; DCE Part No: *
footprint SOT23 (SOT23, 3-Leads, Body 3.0x1.4mm (max), Pitch 0.95mm, IPC Medium Density)
pins: 1 A1, 2 A2, 3 C

## BAT54SLT1G_SOT23-S-DNF
designator D?, comment value (BAT54SLT1G)  (hidden comment: BAT54SLT1G)
Diode Schottky 30V 200mA - Do not Fit; Manufacturer: On Semi; EDM-PN: DIO73; Reutech PN: 5961-ST-0014; Package: SOT23; Text2: *; Text1: *; SAAB PN: *; Part Number: BAT54SLT1G; DCE Part No: *
footprint SOT23 (SOT23, 3-Leads, Body 3.0x1.4mm (max), Pitch 0.95mm, IPC Medium Density)
pins: 1 A1, 2 A2, 3 C

## BAT54SLT1G_SOT23-X
designator D?, comment BAT54SLT1G
Diode Schottky 30V 200mA; Manufacturer: On Semi; EDM-PN: DIO73; Reutech PN: 5961-ST-0014; Package: SOT23; Text2: *; Text1: *; Value: BAT54SLT1G; SAAB PN: *; Part Number: BAT54SLT1G; DCE Part No: *
footprint SOT23 (SOT23, 3-Leads, Body 3.0x1.4mm (max), Pitch 0.95mm, IPC Medium Density)
pins: 1 A1, 2 A2, 3 C

## BAT54SLT1G_SOT23-X-DNF
designator D?, comment value BAT54SLT1G  (hidden comment: BAT54SLT1G-DNF)
Diode Schottky 30V 200mA - Do not Fit; Manufacturer: On Semi; Part Number: DNF - BAT54SLT1G; EDM-PN: DIO73; Reutech PN: 5961-ST-0014; Package: SOT23; Text2: *; Text1: *; SAAB PN: *; DCE Part No: *
footprint SOT23 (SOT23, 3-Leads, Body 3.0x1.4mm (max), Pitch 0.95mm, IPC Medium Density)
pins: 1 A1, 2 A2, 3 C

## BAT54WS-E3-08_SOD323
designator D?, comment BAT54WS-E3-08
Diode Schottky Rectifier 200mA 30V; Manufacturer: Vishay; Reutech PN: 5961-ST-0050; Package: SOD323; EDM-PN: *; Text2: *; Text1: *; Value: BAT54WS-E3-08; SAAB PN: *; Part Number: BAT54WS-E3-08; DCE Part No: *
footprint SOD323 (Diode, SOD323 2-Leads, Body 1.7x1.25mm, IPC Medium Density)
pins: 1 C, 2 A

## BAT60A_SOD323
designator D?, comment value BAT60A  (hidden comment: BAT60AE6327HTSA1)
Diode Schottky Rectifier 10V 3A; Manufacturer: Infineon; EDM-PN: DIO134; Package: SOD323; Text2: *; Text1: *; SAAB PN: *; Part Number: BAT60AE6327HTSA1; DCE Part No: *
footprint SOD323 (Diode, SOD323 2-Leads, Body 1.7x1.25mm, IPC Medium Density)
pins: 1 C, 2 A

## BAT60AE6327HTSA1_SOD323
designator D?, comment value BAT60A  (hidden comment: BAT60AE6327HTSA1)
Diode Schottky Rectifier 10V 3A; Manufacturer: Infineon; EDM-PN: DIO134; Package: SOD323; Text2: *; Text1: *; SAAB PN: *; Part Number: BAT60AE6327HTSA1; DCE Part No: *
footprint SOD323 (Diode, SOD323 2-Leads, Body 1.7x1.25mm, IPC Medium Density)
pins: 1 C, 2 A

## BAT62-02W_SCD80
designator D?, comment BAT62-02W
Diode Schottky; Manufacturer: Infineon; Package: SCD80; EDM-PN: *; Text2: *; Text1: *; Value: BAT62-02W; SAAB PN: *; Part Number: BAT62-02W; DCE Part No: *
footprint SCD80 (SCD80 1.3x0.8mm)
pins: 1 C, 2 A

## BAT165_SOD323
designator D?, comment BAT165
Diode Schottky 40V 750mA; Manufacturer: Infineon; Package: SOD323; EDM-PN: *; Text2: *; Text1: *; Value: BAT165; SAAB PN: *; Part Number: BAT165; DCE Part No: *
footprint SOD323 (Diode, SOD323 2-Leads, Body 1.7x1.25mm, IPC Medium Density)
pins: 1 C, 2 A

## BAT721C_SOT23
designator D?, comment BAT721C
Diode Schottky 40V 200mA; Manufacturer: NXP; Package: SOT23; EDM-PN: *; Text2: *; Text1: *; Value: BAT721C; SAAB PN: *; Part Number: BAT721C; DCE Part No: *
footprint SOT23 (SOT23, 3-Leads, Body 3.0x1.4mm (max), Pitch 0.95mm, IPC Medium Density)
pins: 1 A1, 2 A2, 3 C

## BAT760-7_SOD323
designator D?, comment BAT760-7
Diode Schottky 30V 1A; Manufacturer: Diodes; Package: SOD323; EDM-PN: *; Text2: *; Text1: *; Value: BAT760-7; SAAB PN: *; Part Number: BAT760-7; DCE Part No: *
footprint SOD323 (Diode, SOD323 2-Leads, Body 1.7x1.25mm, IPC Medium Density)
pins: 1 C, 2 A

## BAV19WS-TP_SOD323
designator D?, comment BAV19WS-TP
Diode General 100V 200mA; Manufacturer: MCC; Package: SOD323; EDM-PN: *; Text2: *; Text1: *; Value: BAV19WS-TP; SAAB PN: *; Part Number: BAV19WS-TP; DCE Part No: *
footprint SOD323 (Diode, SOD323 2-Leads, Body 1.7x1.25mm, IPC Medium Density)
pins: 1 C, 2 A
